# Altium footprint library self_pcblib v1.8.6.PcbLib: 123 footprints (part 3 of 8)
Each footprint in its own frame and in the unit in brackets; x right, y up, seen from the top. Pads: shape width x height; smd on the part's side, far side on the other; paste and mask are expansions set on the pad; w line width, h text height; cw(c..) or ccw(c..) is an arc to the next point about the centre after c.
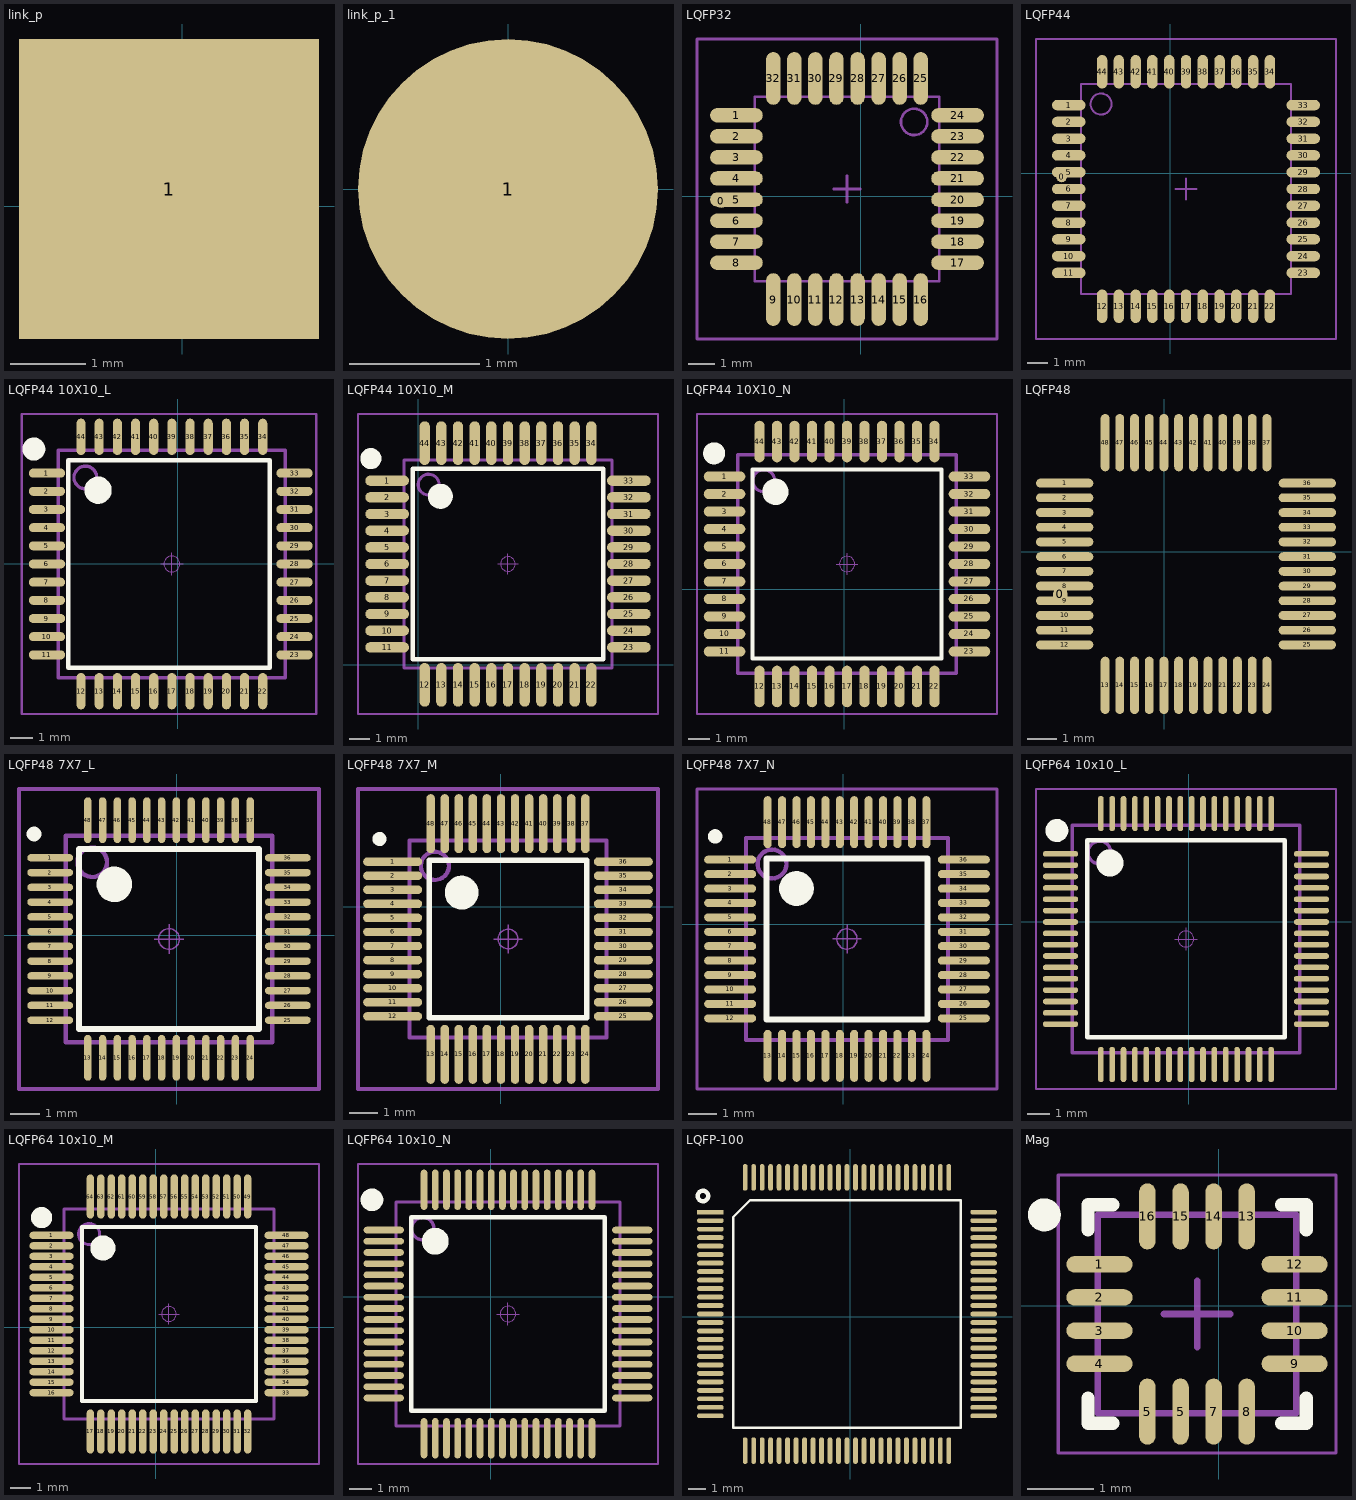
[diagram p2: the footprints below, top view; thin cyan lines are the x and y axes]

## link_p [mm] "焊点"
pads (1):
  rect 4x4 smd: 1(-0.178,0.229)
3D body "link_p.stp": height 0.1, standoff 0, extent -2.178,-1.771 1.822,2.229

## link_p_1 [mm]
pads (1):
  round 2.3 smd: 1(0,0)
3D body "link_p_1.stp": height 0.1, standoff 0, extent -1.15,-1.15 1.15,1.15

## LQFP32 [mm]
pads (33):
  round 0.508 smd: 0(-5.309,-0.178)
  oval 2x0.55 smd: 1(-4.723,3.082) 2(-4.723,2.282) 3(-4.723,1.482) 4(-4.723,0.682) 5(-4.723,-0.118) 6(-4.723,-0.918) 7(-4.723,-1.718) 8(-4.723,-2.518) 17(3.677,-2.518) 18(3.677,-1.718) 19(3.677,-0.918) 20(3.677,-0.118) 21(3.677,0.682) 22(3.677,1.482) 23(3.677,2.282) 24(3.677,3.082)
  oval 0.55x2 smd: 9(-3.323,-3.918) 10(-2.523,-3.918) 11(-1.723,-3.918) 12(-0.923,-3.918) 13(-0.123,-3.918) 14(0.677,-3.918) 15(1.477,-3.918) 16(2.277,-3.918) 25(2.277,4.482) 26(1.477,4.482) 27(0.677,4.482) 28(-0.123,4.482) 29(-0.923,4.482) 30(-1.723,4.482) 31(-2.523,4.482) 32(-3.323,4.482)
Mechanical 13:
  circle w0.1: c2.027,2.832 r0.5
  lines w0.1: -4.023,-3.218 -4.023,3.782 2.977,3.782 2.977,-3.218 -4.023,-3.218
Mechanical 15:
  lines w0.1: -1.023,0.282 -0.023,0.282 ; -0.523,-0.218 -0.523,0.782 ; -6.223,-5.418 -6.223,5.982 5.177,5.982 5.177,-5.418 -6.223,-5.418
3D body "LQFP32.STEP": height 1.63, standoff -0.09, extent -4.998,-4.214 4.002,4.786

## LQFP44 [mm]
pads (45):
  round 0.508 smd: 0(-5.182,-0.178)
  oval 1.6x0.5 smd: 1(-4.836,3.248) 2(-4.836,2.448) 3(-4.836,1.648) 4(-4.836,0.848) 5(-4.836,0.048) 6(-4.836,-0.752) 7(-4.836,-1.552) 8(-4.836,-2.352) 9(-4.836,-3.152) 10(-4.836,-3.952) 11(-4.836,-4.752) 23(6.334,-4.752) 24(6.334,-3.952) 25(6.334,-3.152) 26(6.334,-2.352) 27(6.334,-1.552) 28(6.334,-0.752) 29(6.334,0.048) 30(6.334,0.848) 31(6.334,1.648) 32(6.334,2.448) 33(6.334,3.248)
  oval 0.5x1.6 smd: 12(-3.251,-6.337) 13(-2.451,-6.337) 14(-1.651,-6.337) 15(-0.851,-6.337) 16(-0.051,-6.337) 17(0.749,-6.337) 18(1.549,-6.337) 19(2.349,-6.337) 20(3.149,-6.337) 21(3.949,-6.337) 22(4.749,-6.337) 34(4.749,4.833) 35(3.949,4.833) 36(3.149,4.833) 37(2.349,4.833) 38(1.549,4.833) 39(0.749,4.833) 40(-0.051,4.833) 41(-0.851,4.833) 42(-1.651,4.833) 43(-2.451,4.833) 44(-3.251,4.833)
Mechanical 13:
  circle w0.1: c-3.301,3.298 r0.5
  lines w0.1: -4.251,-5.752 5.749,-5.752 5.749,4.248 -4.251,4.248 -4.251,-5.752
Mechanical 15:
  lines w0.1: 0.249,-0.752 1.249,-0.752 ; 0.749,-1.252 0.749,-0.252 ; -6.401,-7.902 7.899,-7.902 7.899,6.398 -6.401,6.398 -6.401,-7.902
3D body "LQFP44.step": height 1.5, standoff 0.02, extent -5.22,-6.757 6.78,5.243

## LQFP44 10X10_L [mm]
pads (44):
  oval 1.6x0.4 smd: 1(-5.754,4) 2(-5.754,3.2) 3(-5.754,2.4) 4(-5.754,1.6) 5(-5.754,0.8) 6(-5.754,0) 7(-5.754,-0.8) 8(-5.754,-1.6) 9(-5.754,-2.4) 10(-5.754,-3.2) 11(-5.754,-4) 23(5.146,-4) 24(5.146,-3.2) 25(5.146,-2.4) 26(5.146,-1.6) 27(5.146,-0.8) 28(5.146,0) 29(5.146,0.8) 30(5.146,1.6) 31(5.146,2.4) 32(5.146,3.2) 33(5.146,4)
  oval 0.4x1.6 smd: 12(-4.254,-5.6) 13(-3.454,-5.6) 14(-2.654,-5.6) 15(-1.854,-5.6) 16(-1.054,-5.6) 17(-0.254,-5.6) 18(0.546,-5.6) 19(1.346,-5.6) 20(2.146,-5.6) 21(2.946,-5.6) 22(3.746,-5.6) 34(3.746,5.6) 35(2.946,5.6) 36(2.146,5.6) 37(1.346,5.6) 38(0.546,5.6) 39(-0.254,5.6) 40(-1.054,5.6) 41(-1.854,5.6) 42(-2.654,5.6) 43(-3.454,5.6) 44(-4.254,5.6)
Top Overlay:
  circle w0.6: c-3.504,3.25 r0.3
  circle w0.508: c-6.33,5.06 r0.25
  lines w0.2: -4.826,-4.572 4.064,-4.572 4.064,4.572 -4.826,4.572 -4.826,-4.572
Mechanical 13:
  circle w0.15: c-4.064,3.81 r0.5
  lines w0.15: -5.254,-5 -5.254,5 4.746,5 4.746,-5 -5.254,-5
Mechanical 15:
  circle w0.05: c-0.254,0 r0.35
  lines w0.05: -0.754,0 0.246,0 ; -0.254,-0.5 -0.254,0.5
  lines w0.1: -6.858,-6.604 6.096,-6.604 6.096,6.604 -6.858,6.604 -6.858,-6.604
3D body "LQFP44-10x10.STEP": height 1.45, standoff 0, extent -6.254,-6 5.746,6

## LQFP44 10X10_M [mm]
pads (44):
  oval 2.1x0.5 smd: 1(-1.482,8.826) 2(-1.482,8.026) 3(-1.482,7.226) 4(-1.482,6.426) 5(-1.482,5.626) 6(-1.482,4.826) 7(-1.482,4.026) 8(-1.482,3.226) 9(-1.482,2.426) 10(-1.482,1.626) 11(-1.482,0.826) 23(10.118,0.826) 24(10.118,1.626) 25(10.118,2.426) 26(10.118,3.226) 27(10.118,4.026) 28(10.118,4.826) 29(10.118,5.626) 30(10.118,6.426) 31(10.118,7.226) 32(10.118,8.026) 33(10.118,8.826)
  oval 0.5x2.1 smd: 12(0.318,-0.974) 13(1.118,-0.974) 14(1.918,-0.974) 15(2.718,-0.974) 16(3.518,-0.974) 17(4.318,-0.974) 18(5.118,-0.974) 19(5.918,-0.974) 20(6.718,-0.974) 21(7.518,-0.974) 22(8.318,-0.974) 34(8.318,10.626) 35(7.518,10.626) 36(6.718,10.626) 37(5.918,10.626) 38(5.118,10.626) 39(4.318,10.626) 40(3.518,10.626) 41(2.718,10.626) 42(1.918,10.626) 43(1.118,10.626) 44(0.318,10.626)
Top Overlay:
  circle w0.508: c-2.266,9.886 r0.25
  circle w0.6: c1.068,8.076 r0.3
  lines w0.2: -0.254,0.254 -0.254,9.398 8.89,9.398 8.89,0.254 -0.254,0.254
Mechanical 13:
  circle w0.15: c0.508,8.636 r0.5
  lines w0.15: -0.682,-0.174 -0.682,9.826 9.318,9.826 9.318,-0.174 -0.682,-0.174
Mechanical 15:
  circle w0.05: c4.318,4.826 r0.35
  lines w0.05: 3.818,4.826 4.818,4.826 ; 4.318,4.326 4.318,5.326
  lines w0.1: -2.882,-2.374 -2.882,12.026 11.518,12.026 11.518,-2.374 -2.882,-2.374
3D body "LQFP44-10x10.STEP": height 1.45, standoff 0, extent -1.682,-1.174 10.318,10.826

## LQFP44 10X10_N [mm]
pads (44):
  oval 1.9x0.45 smd: 1(-5.473,5.143) 2(-5.473,4.343) 3(-5.473,3.543) 4(-5.473,2.743) 5(-5.473,1.943) 6(-5.473,1.143) 7(-5.473,0.343) 8(-5.473,-0.457) 9(-5.473,-1.257) 10(-5.473,-2.057) 11(-5.473,-2.857) 23(5.727,-2.857) 24(5.727,-2.057) 25(5.727,-1.257) 26(5.727,-0.457) 27(5.727,0.343) 28(5.727,1.143) 29(5.727,1.943) 30(5.727,2.743) 31(5.727,3.543) 32(5.727,4.343) 33(5.727,5.143)
  oval 0.45x1.9 smd: 12(-3.873,-4.457) 13(-3.073,-4.457) 14(-2.273,-4.457) 15(-1.473,-4.457) 16(-0.673,-4.457) 17(0.127,-4.457) 18(0.927,-4.457) 19(1.727,-4.457) 20(2.527,-4.457) 21(3.327,-4.457) 22(4.127,-4.457) 34(4.127,6.743) 35(3.327,6.743) 36(2.527,6.743) 37(1.727,6.743) 38(0.927,6.743) 39(0.127,6.743) 40(-0.673,6.743) 41(-1.473,6.743) 42(-2.273,6.743) 43(-3.073,6.743) 44(-3.873,6.743)
Top Overlay:
  circle w0.6: c-3.145,4.445 r0.3
  circle w0.508: c-5.949,6.203 r0.25
  lines w0.2: -4.191,-3.175 -4.191,5.461 4.445,5.461 4.445,-3.175 -4.191,-3.175
Mechanical 13:
  circle w0.15: c-3.683,4.953 r0.5
  lines w0.15: -4.873,-3.857 -4.873,6.143 5.127,6.143 5.127,-3.857 -4.873,-3.857
Mechanical 15:
  circle w0.05: c0.127,1.143 r0.35
  lines w0.05: -0.373,1.143 0.627,1.143 ; 0.127,0.643 0.127,1.643
  lines w0.1: -6.731,-5.715 -6.731,8.001 6.985,8.001 6.985,-5.715 -6.731,-5.715
3D body "LQFP44-10x10.STEP": height 1.45, standoff 0, extent -5.873,-4.857 6.127,7.143

## LQFP48 [mm]
pads (49):
  round 0.508 smd: 0(-3.531,-1.448)
  oval 1.95x0.3 smd: 1(-3.381,2.336) 2(-3.381,1.836) 3(-3.381,1.336) 4(-3.381,0.836) 5(-3.381,0.336) 6(-3.381,-0.164) 7(-3.381,-0.664) 8(-3.381,-1.164) 9(-3.381,-1.664) 10(-3.381,-2.164) 11(-3.381,-2.664) 12(-3.381,-3.164) 25(4.869,-3.164) 26(4.869,-2.664) 27(4.869,-2.164) 28(4.869,-1.664) 29(4.869,-1.164) 30(4.869,-0.664) 31(4.869,-0.164) 32(4.869,0.336) 33(4.869,0.836) 34(4.869,1.336) 35(4.869,1.836) 36(4.869,2.336)
  oval 0.3x1.95 smd: 13(-2.006,-4.539) 14(-1.506,-4.539) 15(-1.006,-4.539) 16(-0.506,-4.539) 17(-0.006,-4.539) 18(0.494,-4.539) 19(0.994,-4.539) 20(1.494,-4.539) 21(1.994,-4.539) 22(2.494,-4.539) 23(2.994,-4.539) 24(3.494,-4.539) 37(3.494,3.711) 38(2.994,3.711) 39(2.494,3.711) 40(1.994,3.711) 41(1.494,3.711) 42(0.994,3.711) 43(0.494,3.711) 44(-0.006,3.711) 45(-0.506,3.711) 46(-1.006,3.711) 47(-1.506,3.711) 48(-2.006,3.711)
3D body "LQFP48.step": height 1.6, standoff 0.03, extent -3.65,-4.808 5.122,3.964

## LQFP48 7X7_L [mm]
pads (48):
  oval 1.55x0.25 smd: 1(-4.279,2.623) 2(-4.279,2.123) 3(-4.279,1.623) 4(-4.279,1.123) 5(-4.279,0.623) 6(-4.279,0.123) 7(-4.279,-0.377) 8(-4.279,-0.877) 9(-4.279,-1.377) 10(-4.279,-1.877) 11(-4.279,-2.377) 12(-4.279,-2.877) 25(3.771,-2.877) 26(3.771,-2.377) 27(3.771,-1.877) 28(3.771,-1.377) 29(3.771,-0.877) 30(3.771,-0.377) 31(3.771,0.123) 32(3.771,0.623) 33(3.771,1.123) 34(3.771,1.623) 35(3.771,2.123) 36(3.771,2.623)
  oval 0.25x1.55 smd: 13(-3.004,-4.152) 14(-2.504,-4.152) 15(-2.004,-4.152) 16(-1.504,-4.152) 17(-1.004,-4.152) 18(-0.504,-4.152) 19(-0.004,-4.152) 20(0.496,-4.152) 21(0.996,-4.152) 22(1.496,-4.152) 23(1.996,-4.152) 24(2.496,-4.152) 37(2.496,3.898) 38(1.996,3.898) 39(1.496,3.898) 40(0.996,3.898) 41(0.496,3.898) 42(-0.004,3.898) 43(-0.504,3.898) 44(-1.004,3.898) 45(-1.504,3.898) 46(-2.004,3.898) 47(-2.504,3.898) 48(-3.004,3.898)
Top Overlay:
  circle w0.6: c-2.104,1.723 r0.3
  circle w0.25: c-4.826,3.429 r0.125
  lines w0.2: -3.302,-3.175 2.794,-3.175 2.794,2.921 -3.302,2.921 -3.302,-3.175
Mechanical 13:
  circle w0.15: c-2.854,2.473 r0.5
  lines w0.15: -3.754,-3.627 3.246,-3.627 3.246,3.373 -3.754,3.373 -3.754,-3.627
Mechanical 15:
  circle w0.05: c-0.254,-0.127 r0.35
  lines w0.05: -0.754,-0.127 0.246,-0.127 ; -0.254,-0.627 -0.254,0.373
  lines w0.15: -5.334,-5.207 4.826,-5.207 4.826,4.953 -5.334,4.953 -5.334,-5.207
3D body "LQFP48-7x7.STEP": height 1.45, standoff 0, extent -4.754,-4.627 4.246,4.373

## LQFP48 7X7_M [mm]
pads (48):
  oval 2.1x0.3 smd: 1(-3.846,1.607) 2(-3.846,1.107) 3(-3.846,0.607) 4(-3.846,0.107) 5(-3.846,-0.393) 6(-3.846,-0.893) 7(-3.846,-1.393) 8(-3.846,-1.893) 9(-3.846,-2.393) 10(-3.846,-2.893) 11(-3.846,-3.393) 12(-3.846,-3.893) 25(4.354,-3.893) 26(4.354,-3.393) 27(4.354,-2.893) 28(4.354,-2.393) 29(4.354,-1.893) 30(4.354,-1.393) 31(4.354,-0.893) 32(4.354,-0.393) 33(4.354,0.107) 34(4.354,0.607) 35(4.354,1.107) 36(4.354,1.607)
  oval 0.3x2.1 smd: 13(-2.496,-5.243) 14(-1.996,-5.243) 15(-1.496,-5.243) 16(-0.996,-5.243) 17(-0.496,-5.243) 18(0.004,-5.243) 19(0.504,-5.243) 20(1.004,-5.243) 21(1.504,-5.243) 22(2.004,-5.243) 23(2.504,-5.243) 24(3.004,-5.243) 37(3.004,2.957) 38(2.504,2.957) 39(2.004,2.957) 40(1.504,2.957) 41(1.004,2.957) 42(0.504,2.957) 43(0.004,2.957) 44(-0.496,2.957) 45(-0.996,2.957) 46(-1.496,2.957) 47(-1.996,2.957) 48(-2.496,2.957)
Top Overlay:
  circle w0.6: c-1.396,0.507 r0.3
  circle w0.25: c-4.318,2.413 r0.125
  lines w0.2: -2.54,-3.937 3.048,-3.937 3.048,1.651 -2.54,1.651 -2.54,-3.937
Mechanical 13:
  circle w0.15: c-2.346,1.457 r0.5
  lines w0.15: -3.246,-4.643 3.754,-4.643 3.754,2.357 -3.246,2.357 -3.246,-4.643
Mechanical 15:
  circle w0.05: c0.254,-1.143 r0.35
  lines w0.05: -0.246,-1.143 0.754,-1.143 ; 0.254,-1.643 0.254,-0.643
  lines w0.15: -5.08,-6.477 5.588,-6.477 5.588,4.191 -5.08,4.191 -5.08,-6.477
3D body "LQFP48-7x7.STEP": height 1.45, standoff 0, extent -4.246,-5.643 4.754,3.357

## LQFP48 7X7_N [mm]
pads (48):
  oval 1.8x0.279 smd: 1(-3.923,2.242) 2(-3.923,1.742) 3(-3.923,1.242) 4(-3.923,0.742) 5(-3.923,0.242) 6(-3.923,-0.258) 7(-3.923,-0.758) 8(-3.923,-1.258) 9(-3.923,-1.758) 10(-3.923,-2.258) 11(-3.923,-2.758) 12(-3.923,-3.258) 25(4.177,-3.258) 26(4.177,-2.758) 27(4.177,-2.258) 28(4.177,-1.758) 29(4.177,-1.258) 30(4.177,-0.758) 31(4.177,-0.258) 32(4.177,0.242) 33(4.177,0.742) 34(4.177,1.242) 35(4.177,1.742) 36(4.177,2.242)
  oval 0.279x1.8 smd: 13(-2.623,-4.558) 14(-2.123,-4.558) 15(-1.623,-4.558) 16(-1.123,-4.558) 17(-0.623,-4.558) 18(-0.123,-4.558) 19(0.377,-4.558) 20(0.877,-4.558) 21(1.377,-4.558) 22(1.877,-4.558) 23(2.377,-4.558) 24(2.877,-4.558) 37(2.877,3.542) 38(2.377,3.542) 39(1.877,3.542) 40(1.377,3.542) 41(0.877,3.542) 42(0.377,3.542) 43(-0.123,3.542) 44(-0.623,3.542) 45(-1.123,3.542) 46(-1.623,3.542) 47(-2.123,3.542) 48(-2.623,3.542)
Top Overlay:
  circle w0.6: c-1.623,1.242 r0.3
  circle w0.25: c-4.445,3.048 r0.125
  lines w0.2: -2.667,-3.302 2.921,-3.302 2.921,2.286 -2.667,2.286 -2.667,-3.302
Mechanical 13:
  circle w0.15: c-2.473,2.092 r0.5
  lines w0.15: -3.373,-4.008 -3.373,2.992 3.627,2.992 3.627,-4.008 -3.373,-4.008
Mechanical 15:
  circle w0.05: c0.127,-0.508 r0.35
  lines w0.05: -0.373,-0.508 0.627,-0.508 ; 0.127,-1.008 0.127,-0.008
  lines w0.1: -5.073,-5.708 5.327,-5.708 5.327,4.692 -5.073,4.692 -5.073,-5.708
3D body "LQFP48-7x7.STEP": height 1.45, standoff 0, extent -4.373,-5.008 4.627,3.992

## LQFP64 10x10_L [mm]
pads (64):
  oval 1.55x0.25 smd: 1(-5.652,2.988) 2(-5.652,2.488) 3(-5.652,1.988) 4(-5.652,1.488) 5(-5.652,0.988) 6(-5.652,0.488) 7(-5.652,-0.012) 8(-5.652,-0.512) 9(-5.652,-1.012) 10(-5.652,-1.512) 11(-5.652,-2.012) 12(-5.652,-2.512) 13(-5.652,-3.012) 14(-5.652,-3.512) 15(-5.652,-4.012) 16(-5.652,-4.512) 33(5.398,-4.512) 34(5.398,-4.012) 35(5.398,-3.512) 36(5.398,-3.012) 37(5.398,-2.512) 38(5.398,-2.012) 39(5.398,-1.512) 40(5.398,-1.012) 41(5.398,-0.512) 42(5.398,-0.012) 43(5.398,0.488) 44(5.398,0.988) 45(5.398,1.488) 46(5.398,1.988) 47(5.398,2.488) 48(5.398,2.988)
  oval 0.25x1.55 smd: 17(-3.877,-6.287) 18(-3.377,-6.287) 19(-2.877,-6.287) 20(-2.377,-6.287) 21(-1.877,-6.287) 22(-1.377,-6.287) 23(-0.877,-6.287) 24(-0.377,-6.287) 25(0.123,-6.287) 26(0.623,-6.287) 27(1.123,-6.287) 28(1.623,-6.287) 29(2.123,-6.287) 30(2.623,-6.287) 31(3.123,-6.287) 32(3.623,-6.287) 49(3.623,4.763) 50(3.123,4.763) 51(2.623,4.763) 52(2.123,4.763) 53(1.623,4.763) 54(1.123,4.763) 55(0.623,4.763) 56(0.123,4.763) 57(-0.377,4.763) 58(-0.877,4.763) 59(-1.377,4.763) 60(-1.877,4.763) 61(-2.377,4.763) 62(-2.877,4.763) 63(-3.377,4.763) 64(-3.877,4.763)
Top Overlay:
  circle w0.6: c-3.477,2.588 r0.3
  circle w0.508: c-5.813,4.013 r0.25
  lines w0.2: -4.477,-5.08 4.223,-5.08 4.223,3.588 -4.477,3.588 -4.477,-5.08
Mechanical 13:
  circle w0.15: c-3.937,3.048 r0.5
  lines w0.15: -5.127,-5.762 4.873,-5.762 4.873,4.238 -5.127,4.238 -5.127,-5.762
Mechanical 15:
  circle w0.05: c-0.127,-0.762 r0.35
  lines w0.05: -0.627,-0.762 0.373,-0.762 ; -0.127,-1.262 -0.127,-0.262
  lines w0.1: -6.731,-7.366 6.477,-7.366 6.477,5.842 -6.731,5.842 -6.731,-7.366
3D body "LQFP64-10x10.STEP": height 1.45, standoff 0, extent -6.127,-6.762 5.873,5.238

## LQFP64 10x10_M [mm]
pads (64):
  oval 2.1x0.35 smd: 1(-4.965,4.385) 2(-4.965,3.885) 3(-4.965,3.385) 4(-4.965,2.885) 5(-4.965,2.385) 6(-4.965,1.885) 7(-4.965,1.385) 8(-4.965,0.885) 9(-4.965,0.385) 10(-4.965,-0.115) 11(-4.965,-0.615) 12(-4.965,-1.115) 13(-4.965,-1.615) 14(-4.965,-2.115) 15(-4.965,-2.615) 16(-4.965,-3.115) 33(6.235,-3.115) 34(6.235,-2.615) 35(6.235,-2.115) 36(6.235,-1.615) 37(6.235,-1.115) 38(6.235,-0.615) 39(6.235,-0.115) 40(6.235,0.385) 41(6.235,0.885) 42(6.235,1.385) 43(6.235,1.885) 44(6.235,2.385) 45(6.235,2.885) 46(6.235,3.385) 47(6.235,3.885) 48(6.235,4.385)
  oval 0.35x2.1 smd: 17(-3.115,-4.965) 18(-2.615,-4.965) 19(-2.115,-4.965) 20(-1.615,-4.965) 21(-1.115,-4.965) 22(-0.615,-4.965) 23(-0.115,-4.965) 24(0.385,-4.965) 25(0.885,-4.965) 26(1.385,-4.965) 27(1.885,-4.965) 28(2.385,-4.965) 29(2.885,-4.965) 30(3.385,-4.965) 31(3.885,-4.965) 32(4.385,-4.965) 49(4.385,6.235) 50(3.885,6.235) 51(3.385,6.235) 52(2.885,6.235) 53(2.385,6.235) 54(1.885,6.235) 55(1.385,6.235) 56(0.885,6.235) 57(0.385,6.235) 58(-0.115,6.235) 59(-0.615,6.235) 60(-1.115,6.235) 61(-1.615,6.235) 62(-2.115,6.235) 63(-2.615,6.235) 64(-3.115,6.235)
Top Overlay:
  circle w0.6: c-2.515,3.785 r0.3
  circle w0.508: c-5.441,5.227 r0.25
  lines w0.2: -3.515,-3.515 4.785,-3.515 4.785,4.785 -3.515,4.785 -3.515,-3.515
Mechanical 13:
  circle w0.15: c-3.175,4.445 r0.5
  lines w0.15: -4.365,-4.365 -4.365,5.635 5.635,5.635 5.635,-4.365 -4.365,-4.365
Mechanical 15:
  circle w0.05: c0.635,0.635 r0.35
  lines w0.05: 0.135,0.635 1.135,0.635 ; 0.635,0.135 0.635,1.135
  lines w0.1: -6.515,-6.515 7.785,-6.515 7.785,7.785 -6.515,7.785 -6.515,-6.515
3D body "LQFP64-10x10.STEP": height 1.45, standoff 0, extent -5.365,-5.365 6.635,6.635

## LQFP64 10x10_N [mm]
pads (64):
  oval 1.8x0.3 smd: 1(-4.788,2.988) 2(-4.788,2.488) 3(-4.788,1.988) 4(-4.788,1.488) 5(-4.788,0.988) 6(-4.788,0.488) 7(-4.788,-0.012) 8(-4.788,-0.512) 9(-4.788,-1.012) 10(-4.788,-1.512) 11(-4.788,-2.012) 12(-4.788,-2.512) 13(-4.788,-3.012) 14(-4.788,-3.512) 15(-4.788,-4.012) 16(-4.788,-4.512) 33(6.312,-4.512) 34(6.312,-4.012) 35(6.312,-3.512) 36(6.312,-3.012) 37(6.312,-2.512) 38(6.312,-2.012) 39(6.312,-1.512) 40(6.312,-1.012) 41(6.312,-0.512) 42(6.312,-0.012) 43(6.312,0.488) 44(6.312,0.988) 45(6.312,1.488) 46(6.312,1.988) 47(6.312,2.488) 48(6.312,2.988)
  oval 0.3x1.8 smd: 17(-2.988,-6.312) 18(-2.488,-6.312) 19(-1.988,-6.312) 20(-1.488,-6.312) 21(-0.988,-6.312) 22(-0.488,-6.312) 23(0.012,-6.312) 24(0.512,-6.312) 25(1.012,-6.312) 26(1.512,-6.312) 27(2.012,-6.312) 28(2.512,-6.312) 29(3.012,-6.312) 30(3.512,-6.312) 31(4.012,-6.312) 32(4.512,-6.312) 49(4.512,4.788) 50(4.012,4.788) 51(3.512,4.788) 52(3.012,4.788) 53(2.512,4.788) 54(2.012,4.788) 55(1.512,4.788) 56(1.012,4.788) 57(0.512,4.788) 58(0.012,4.788) 59(-0.488,4.788) 60(-0.988,4.788) 61(-1.488,4.788) 62(-1.988,4.788) 63(-2.488,4.788) 64(-2.988,4.788)
Top Overlay:
  circle w0.6: c-2.488,2.488 r0.3
  circle w0.508: c-5.314,4.338 r0.25
  lines w0.2: -3.556,-5.08 -3.556,3.556 5.08,3.556 5.08,-5.08 -3.556,-5.08
Mechanical 13:
  circle w0.15: c-3.048,3.048 r0.5
  lines w0.15: -4.238,-5.762 5.762,-5.762 5.762,4.238 -4.238,4.238 -4.238,-5.762
Mechanical 15:
  circle w0.05: c0.762,-0.762 r0.35
  lines w0.05: 0.262,-0.762 1.262,-0.762 ; 0.762,-1.262 0.762,-0.262
  lines w0.1: -5.938,-7.462 -5.938,5.938 7.462,5.938 7.462,-7.462 -5.938,-7.462
3D body "LQFP64-10x10.STEP": height 1.45, standoff 0, extent -5.238,-6.762 6.762,5.238

## LQFP-100 [mil]
pads (100):
  rect 62x11.02 smd: 1(-325,242.5)
  oval 62x11.02 smd: 2(-325,222.81) 3(-325,203.13) 4(-325,183.44) 5(-325,163.76) 6(-325,144.07) 7(-325,124.39) 8(-325,104.7) 9(-325,85.02) 10(-325,65.33) 11(-325,45.65) 12(-325,25.96) 13(-325,6.28) 14(-325,-13.4) 15(-325,-33.09) 16(-325,-52.77) 17(-325,-72.46) 18(-325,-92.14) 19(-325,-111.83) 20(-325,-131.51) 21(-325,-151.2) 22(-325,-170.88) 23(-325,-190.57) 24(-325,-210.25) 25(-325,-229.94) 51(308.87,-229.94) 52(308.87,-210.25) 53(308.87,-190.57) 54(308.87,-170.88) 55(308.87,-151.2) 56(308.87,-131.51) 57(308.87,-111.83) 58(308.87,-92.14) 59(308.87,-72.46) 60(308.87,-52.77) 61(308.87,-33.09) 62(308.87,-13.4) 63(308.87,6.28) 64(308.87,25.96) 65(308.87,45.65) 66(308.87,65.33) 67(308.87,85.02) 68(308.87,104.7) 69(308.87,124.39) 70(308.87,144.07) 71(308.87,163.76) 72(308.87,183.44) 73(308.87,203.13) 74(308.87,222.81) 75(308.87,242.5)
  oval 11.02x62 smd: 26(-244.28,-310.66) 27(-224.6,-310.66) 28(-204.91,-310.66) 29(-185.23,-310.66) 30(-165.54,-310.66) 31(-145.86,-310.66) 32(-126.17,-310.66) 33(-106.49,-310.66) 34(-86.8,-310.66) 35(-67.12,-310.66) 36(-47.43,-310.66) 37(-27.75,-310.66) 38(-8.06,-310.66) 39(11.62,-310.66) 40(31.31,-310.66) 41(50.99,-310.66) 42(70.68,-310.66) 43(90.36,-310.66) 44(110.05,-310.66) 45(129.73,-310.66) 46(149.42,-310.66) 47(169.1,-310.66) 48(188.79,-310.66) 49(208.47,-310.66) 50(228.16,-310.66) 76(228.16,323.22) 77(208.47,323.22) 78(188.79,323.22) 79(169.1,323.22) 80(149.42,323.22) 81(129.73,323.22) 82(110.05,323.22) 83(90.36,323.22) 84(70.68,323.22) 85(50.99,323.22) 86(31.31,323.22) 87(11.62,323.22) 88(-8.06,323.22) 89(-27.75,323.22) 90(-47.43,323.22) 91(-67.12,323.22) 92(-86.8,323.22) 93(-106.49,323.22) 94(-126.17,323.22) 95(-145.86,323.22) 96(-165.54,323.22) 97(-185.23,323.22) 98(-204.91,323.22) 99(-224.6,323.22) 100(-244.28,323.22)
Top Overlay:
  circle w10: c-342.17,280 r12.16
  lines w5.91: -272.24,-257.89 -272.24,230.69 -232.47,270.45 256.11,270.45 256.11,-257.89 -272.24,-257.89
3D body "LQFP100.step": height 62.99, standoff 0, extent -323.31,-310.66 307.19,319.84

## Mag [mm] "磁力计"
pads (16):
  oval 1x0.25 smd: 1(-1.805,0.623) 2(-1.805,0.123) 3(-1.805,-0.377) 4(-1.805,-0.877) 9(1.145,-0.877) 10(1.145,-0.377) 11(1.145,0.123) 12(1.145,0.623)
  oval 0.25x1 smd: 5(-1.08,-1.602) 5(-0.58,-1.602) 7(-0.08,-1.602) 8(0.42,-1.602) 13(0.42,1.348) 14(-0.08,1.348) 15(-0.58,1.348) 16(-1.08,1.348)
Top Overlay:
  circle w0.25: c-2.64,1.372 r0.125
  lines w0.2: -1.98,-1.402 -1.98,-1.777 -1.605,-1.777 ; -1.98,1.148 -1.98,1.523 -1.605,1.523 ; 0.945,-1.777 1.32,-1.777 1.32,-1.402 ; 0.945,1.523 1.32,1.523 1.32,1.148
Mechanical 13:
  lines w0.1: -1.83,-1.627 -1.83,1.373 1.17,1.373 1.17,-1.627 -1.83,-1.627
Mechanical 15:
  lines w0.05: -2.43,-2.227 -2.43,1.973 1.77,1.973 1.77,-2.227 -2.43,-2.227
  lines w0.1: -0.83,-0.127 0.17,-0.127 ; -0.33,-0.627 -0.33,0.373
3D body: height 1, standoff 0.05, extent -1.83,-1.627 1.17,1.373